# Altium footprint library HLib_footprint_Hien.PcbLib: 58 footprints (part 3 of 4)
Each footprint in its own frame and in the unit in brackets; x right, y up, seen from the top. Pads: shape width x height; smd on the part's side, far side on the other; paste and mask are expansions set on the pad; w line width, h text height; cw(c..) or ccw(c..) is an arc to the next point about the centre after c.
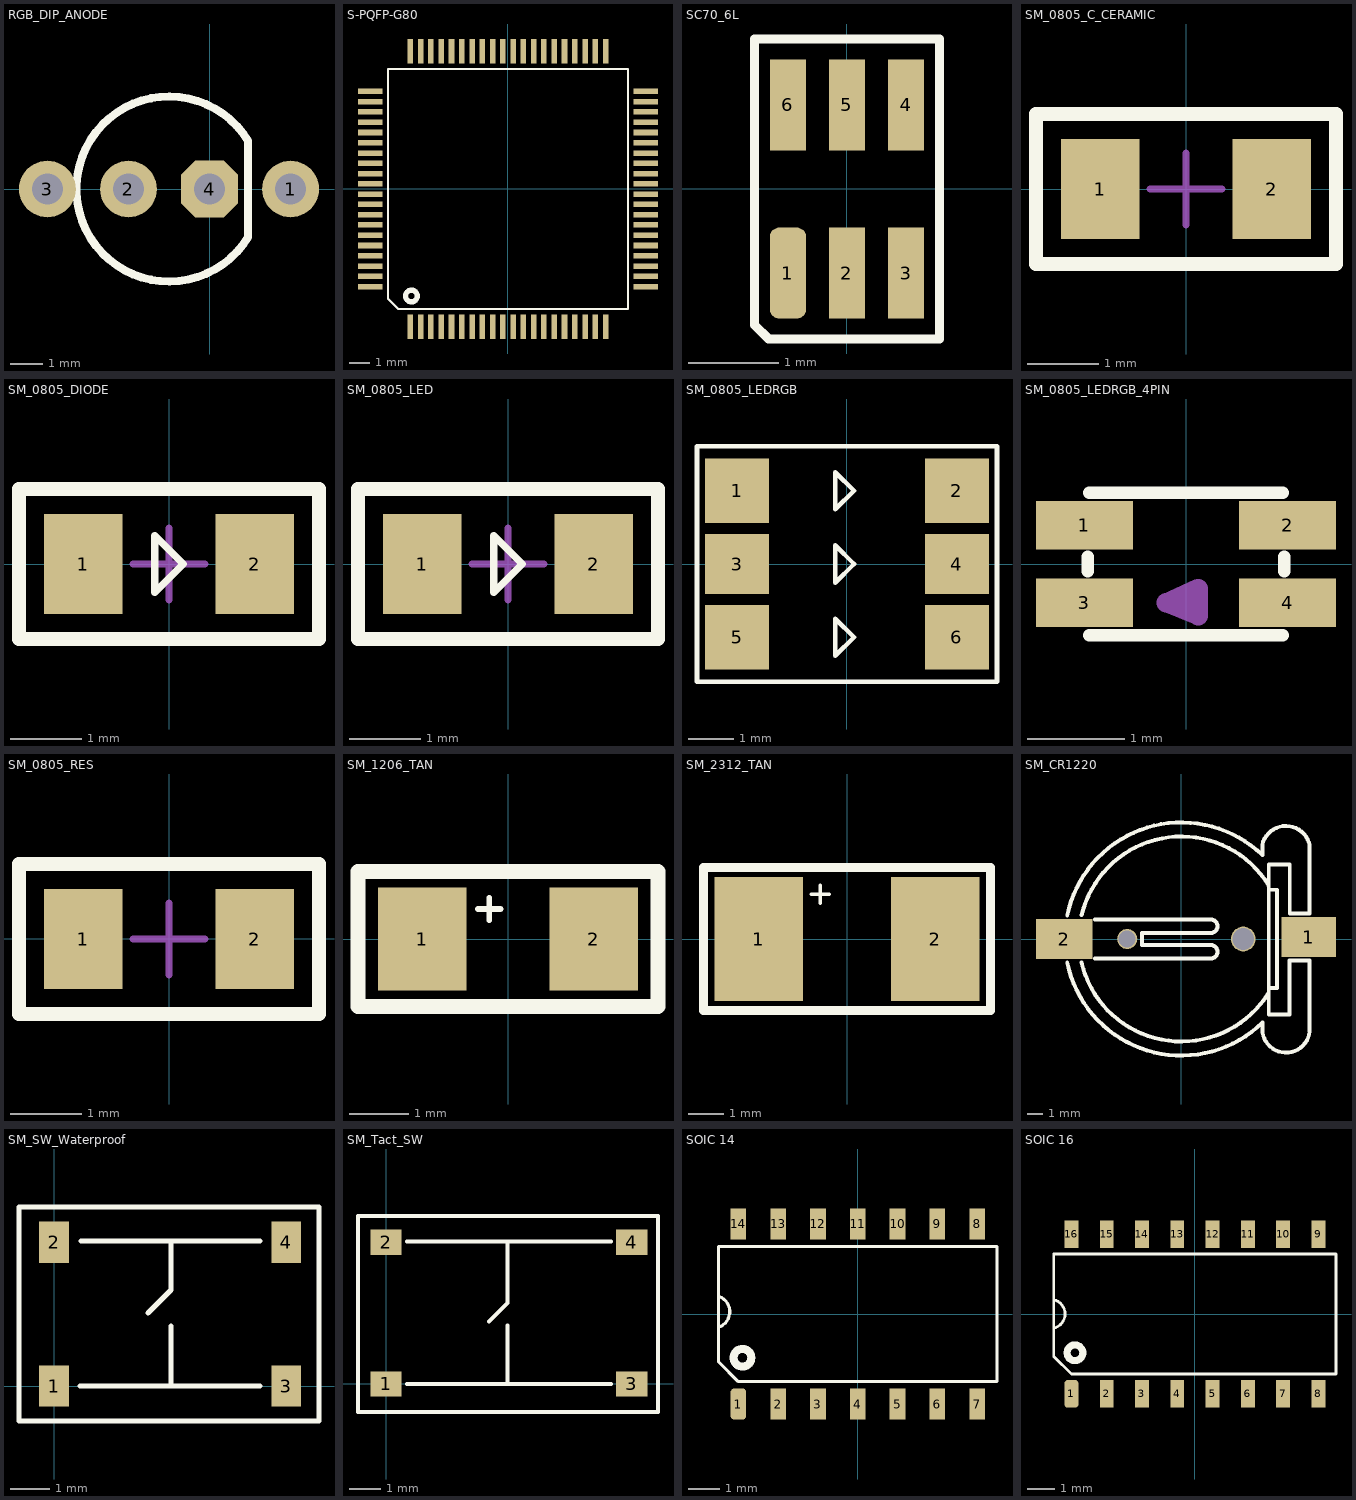
[diagram p2: the footprints below, top view; thin cyan lines are the x and y axes]

## RGB_DIP_ANODE [mil]
pads (4):
  round 70 hole 38: 1(100,0) 2(-100,0) 3(-200,0)
  oct 70x70 hole 38: 4(0,0)
Top Overlay:
  lines w10: 47.49,-59.43 cw(c-50,0) 47.49,59.43 47.49,-59.43

## S-PQFP-G80 [mm]
pads (80):
  rect 0.27x1.2 smd: 1(-4.75,-6.7) 2(-4.25,-6.7) 3(-3.75,-6.7) 4(-3.25,-6.7) 5(-2.75,-6.7) 6(-2.25,-6.7) 7(-1.75,-6.7) 8(-1.25,-6.7) 9(-0.75,-6.7) 10(-0.25,-6.7) 11(0.25,-6.7) 12(0.75,-6.7) 13(1.25,-6.7) 14(1.75,-6.7) 15(2.25,-6.7) 16(2.75,-6.7) 17(3.25,-6.7) 18(3.75,-6.7) 19(4.25,-6.7) 20(4.75,-6.7) 41(4.75,6.7) 42(4.25,6.7) 43(3.75,6.7) 44(3.25,6.7) 45(2.75,6.7) 46(2.25,6.7) 47(1.75,6.7) 48(1.25,6.7) 49(0.75,6.7) 50(0.25,6.7) 51(-0.25,6.7) 52(-0.75,6.7) 53(-1.25,6.7) 54(-1.75,6.7) 55(-2.25,6.7) 56(-2.75,6.7) 57(-3.25,6.7) 58(-3.75,6.7) 59(-4.25,6.7) 60(-4.75,6.7)
  rect 1.2x0.27 smd: 21(6.7,-4.75) 22(6.7,-4.25) 23(6.7,-3.75) 24(6.7,-3.25) 25(6.7,-2.75) 26(6.7,-2.25) 27(6.7,-1.75) 28(6.7,-1.25) 29(6.7,-0.75) 30(6.7,-0.25) 31(6.7,0.25) 32(6.7,0.75) 33(6.7,1.25) 34(6.7,1.75) 35(6.7,2.25) 36(6.7,2.75) 37(6.7,3.25) 38(6.7,3.75) 39(6.7,4.25) 40(6.7,4.75) 61(-6.7,4.75) 62(-6.7,4.25) 63(-6.7,3.75) 64(-6.7,3.25) 65(-6.7,2.75) 66(-6.7,2.25) 67(-6.7,1.75) 68(-6.7,1.25) 69(-6.7,0.75) 70(-6.7,0.25) 71(-6.7,-0.25) 72(-6.7,-0.75) 73(-6.7,-1.25) 74(-6.7,-1.75) 75(-6.7,-2.25) 76(-6.7,-2.75) 77(-6.7,-3.25) 78(-6.7,-3.75) 79(-6.7,-4.25) 80(-6.7,-4.75)
Top Overlay:
  circle w0.254: c-4.699,-5.207 r0.284
  lines w0.1: -5.842,-5.334 -5.842,5.842 5.842,5.842 5.842,-5.842 -5.334,-5.842 -5.842,-5.334
3D body: height 1.52, standoff -0.04, extent -7,-7 7,7

## SC70_6L [mm] "ESD protection IC"
pads (6):
  rrect50% 0.4x1 smd: 1(-0.65,-0.925)
  rect 0.4x1 smd: 2(0,-0.925) 3(0.65,-0.925) 4(0.65,0.925) 5(0,0.925) 6(-0.65,0.925)
Top Overlay:
  lines w0.1: -1.016,-1.499 -1.016,1.651 1.016,1.651 1.016,-1.651 -0.864,-1.651 -1.016,-1.499
3D body: height 0.92, standoff -0.03, extent -1,-1.05 1,1.05

## SM_0805_C_CERAMIC [mm] "SM capacitor"
pads (2):
  rect 1.1x1.4 smd: 1(-1.2,0) 2(1.2,0)
Top Overlay:
  lines w0.2: -2.1,-1.05 2.1,-1.05 2.1,1.05 -2.1,1.05 -2.1,-1.05
Mechanical 15:
  lines w0.1: -0.5,0 0.5,0 ; 0,-0.5 0,0.5 ; -2.1,-1.05 -2.1,1.05 2.1,1.05 2.1,-1.05 -2.1,-1.05
3D body: height 0.58, standoff -0.02, extent -1,-0.625 1,0.625

## SM_0805_DIODE [mm] "SM diode"
pads (2):
  rect 1.1x1.4 smd: 1(-1.2,0) 2(1.2,0)
Top Overlay:
  lines w0.1: -0.2,-0.4 -0.2,0.4 0.2,0 -0.2,-0.4
  lines w0.2: -2.1,-1.05 -2.1,1.05 2.1,1.05 2.1,-1.05 -2.1,-1.05
Mechanical 15:
  lines w0.1: -0.5,0 0.5,0 ; 0,-0.5 0,0.5 ; -2.1,-1.05 2.1,-1.05 2.1,1.05 -2.1,1.05 -2.1,-1.05
3D body: height 0.81, standoff 0, extent -1.262,-0.65 1.238,0.65

## SM_0805_LED [mm] "SM led"
pads (2):
  rect 1.1x1.4 smd: 1(-1.2,0) 2(1.2,0)
Top Overlay:
  lines w0.1: -0.2,-0.4 -0.2,0.4 0.2,0 -0.2,-0.4
  lines w0.2: -2.1,-1.05 -2.1,1.05 2.1,1.05 2.1,-1.05 -2.1,-1.05
Mechanical 15:
  lines w0.1: -0.5,0 0.5,0 ; 0,-0.5 0,0.5 ; -2.1,-1.05 2.1,-1.05 2.1,1.05 -2.1,1.05 -2.1,-1.05
3D body: height 1.1, standoff 0, extent -1.01,-0.625 1.01,0.625

## SM_0805_LEDRGB [mm] "Surface-mount led RGB"
pads (6):
  rect 1.4x1.4 smd: 1(-2.4,1.6) 2(2.4,1.6) 5(-2.4,-1.6) 6(2.4,-1.6)
  rect 1.4x1.3 smd: 3(-2.4,0) 4(2.4,0)
Top Overlay:
  lines w0.1: -3.275,-2.575 3.275,-2.575 3.275,2.575 -3.275,2.575 -3.275,-2.575 ; -0.254,-2.006 0.152,-1.6 -0.254,-1.194 -0.254,-2.006 ; -0.254,-0.406 0.152,0 -0.254,0.407 -0.254,-0.406 ; -0.254,1.194 -0.254,2.007 0.152,1.6 -0.254,1.194
3D body: height 2, standoff 0, extent -2.7,-2.5 2.7,2.5

## SM_0805_LEDRGB_4PIN [mm] "surface-mount RGB led 4pin, common Anode"
pads (4):
  rect 1x0.5 smd: 1(-1.05,0.4) 2(1.05,0.4) 3(-1.05,-0.4) 4(1.05,-0.4)
Top Overlay:
  lines w0.127: -1.016,-0.076 -1.016,0.076 ; -1,-0.737 1,-0.737 ; -1,0.737 1,0.737 ; 1.016,-0.076 1.016,0.076
Mechanical 15:
  lines w0.2: -0.203,-0.4 0.127,-0.533 0.127,-0.254 -0.203,-0.4
3D body: height 0.34, standoff -0.01, extent -0.8,-0.75 0.8,0.75

## SM_0805_RES [mm] "SM resistor"
pads (2):
  rect 1.1x1.4 smd: 1(-1.2,0) 2(1.2,0)
Top Overlay:
  lines w0.2: -2.1,-1.05 -2.1,1.05 2.1,1.05 2.1,-1.05 -2.1,-1.05
Mechanical 15:
  lines w0.1: -0.5,0 0.5,0 ; 0,-0.5 0,0.5 ; -2.1,-1.05 2.1,-1.05 2.1,1.05 -2.1,1.05 -2.1,-1.05
3D body: height 0.45, standoff 0, extent -1,-0.629 1,0.621

## SM_1206_TAN [mm] "Tantalum 1206"
pads (2):
  rect 1.5x1.75 smd: 1(-1.45,0) 2(1.45,0)
Top Overlay:
  lines w0.1: -0.508,0.508 -0.127,0.508 ; -0.318,0.318 -0.318,0.508 -0.318,0.699
  lines w0.254: -2.54,-1.143 2.54,-1.143 2.54,1.143 -2.54,1.143 -2.54,-1.143
3D body: height 1.63, standoff -0.02, extent -1.672,-0.802 1.718,0.798

## SM_2312_TAN [mm]
pads (2):
  rect 2.5x3.5 smd: 1(-2.5,0) 2(2.5,0)
Top Overlay:
  lines w0.1: -1.016,1.27 -0.508,1.27 ; -0.762,1.016 -0.762,1.524
  lines w0.254: -4.064,-2.032 -4.064,2.032 4.064,2.032 4.064,-2.032 -4.064,-2.032
3D body: height 2.5, standoff 0, extent -3,-1.6 3,1.6

## SM_CR1220 [mm] "Surface-mount battery holder CR1220"
height 0.7
pads (4):
  rect 3.54x2.6 smd: 1(8.23,0.127)
  rect 3.66x2.6 smd: 2(-7.57,0)
  round 1.3 hole 1.1: ""(-3.5,0)
  round 1.6 hole 1.4: ""(4,0)
Top Overlay:
  lines w0.254: -7.381,-1.527 ccw(c0,0) 5.249,-5.409 5.249,-6.041 ; -7.38,1.53 cw(c0,0) 5.234,5.424 5.234,6.086 ; -6.455,-1.511 ccw(c0,0) 5.644,-3.479 ; -6.448,1.541 cw(c0,0) 5.648,3.473 ; -5.588,-1.27 1.905,-1.27 ccw(c1.9,-0.83) 2.34,-0.83 ccw(c1.901,-0.83) 1.906,-0.391 ; -5.588,1.27 1.905,1.27 cw(c1.9,0.83) 2.34,0.83 cw(c1.9,0.83) 1.905,0.39 ; 1.901,-0.381 -2.54,-0.381 -2.54,0.381 1.905,0.381 ; 5.23,6.087 cw(c6.76,5.74) 8.3,6.04 8.3,1.651 7.011,1.651 7.01,1.65 7.01,4.82 5.65,4.82 5.65,-4.89 7,-4.89 7,-1.4 8.297,-1.4 8.3,-1.397 8.3,-5.95 ; 5.24,-6.05 5.249,-6.041 ; 5.65,-3.165 6.175,-3.165 6.175,3.185 5.65,3.185 ; 8.302,-5.95 cw(c6.77,-5.81) 5.249,-6.041
3D body: height 3.99, standoff -0.95, extent -8.742,-7.493 9.758,7.504

## SM_SW_Waterproof [mm] "Switch 4 pins waterproof"
pads (4):
  rect 0.75x1.05 smd: 1(0,0) 2(0,3.65) 3(5.9,0) 4(5.9,3.65)
Top Overlay:
  lines w0.127: 0.66,0 5.232,0 ; 0.686,3.683 5.232,3.683 ; 2.388,1.854 2.972,2.438 2.972,3.658 ; 2.972,0 2.972,1.524 ; -0.889,-0.889 -0.889,4.547 6.731,4.547 6.731,-0.889 -0.889,-0.889
3D body: height 1.5, standoff 0, extent -0.254,-0.771 6.146,4.429

## SM_Tact_SW [mm] "Surface-mount tact switch"
pads (4):
  rect 1x0.8 smd: 1(0,0) 2(0,4.5) 3(7.8,0) 4(7.8,4.5)
Top Overlay:
  lines w0.127: 0.66,0 7.137,0 ; 0.66,4.521 7.137,4.521 ; 3.277,1.981 3.861,2.565 3.861,2.692 3.861,4.521 ; 3.861,0 3.861,1.854 ; -0.889,-0.889 -0.889,5.334 8.636,5.334 8.636,-0.889 -0.889,-0.889
3D body: height 5, standoff -0.05, extent -0.163,-0.739 7.987,5.261

## SOIC 14 [mm]
pads (14):
  rrect50% 0.5x1 smd: 1(-3.81,-2.875)
  rect 0.5x1 smd: 2(-2.54,-2.875) 3(-1.27,-2.875) 4(0,-2.875) 5(1.27,-2.875) 6(2.54,-2.875) 7(3.81,-2.875) 8(3.81,2.875) 9(2.54,2.875) 10(1.27,2.875) 11(0,2.875) 12(-1.27,2.875) 13(-2.54,2.875) 14(-3.81,2.875)
Top Overlay:
  circle w0.254: c-3.683,-1.397 r0.284
  lines w0.1: -4.425,0.563 cw(c-4.608,0.072) -4.374,-0.396 ; -4.445,-1.524 -3.81,-2.159 4.445,-2.159 4.445,2.159 -4.445,2.159 -4.445,-1.524
3D body: height 1.6, standoff 0, extent -4.345,-2.995 4.345,2.995

## SOIC 16 [mm]
pads (16):
  rrect50% 0.5x1 smd: 1(-4.445,-2.875)
  rect 0.5x1 smd: 2(-3.175,-2.875) 3(-1.905,-2.875) 4(-0.635,-2.875) 5(0.635,-2.875) 6(1.905,-2.875) 7(3.175,-2.875) 8(4.445,-2.875) 9(4.445,2.875) 10(3.175,2.875) 11(1.905,2.875) 12(0.635,2.875) 13(-0.635,2.875) 14(-1.905,2.875) 15(-3.175,2.875) 16(-4.445,2.875)
Top Overlay:
  circle w0.254: c-4.318,-1.397 r0.284
  lines w0.1: -5.08,-0.508 ccw(c-5.197,0.002) -5.079,0.513 ; -5.08,-1.524 -4.445,-2.159 5.08,-2.159 5.08,2.159 -5.08,2.159 -5.08,-1.524
3D body: height 1.4, standoff 0, extent -4.95,-3 4.95,3